# Altium footprint library PcbLib_ICs.PcbLib: 317 footprints (part 9 of 24)
Each footprint in its own frame and in the unit in brackets; x right, y up, seen from the top. Pads: shape width x height; smd on the part's side, far side on the other; paste and mask are expansions set on the pad; w line width, h text height; cw(c..) or ccw(c..) is an arc to the next point about the centre after c.
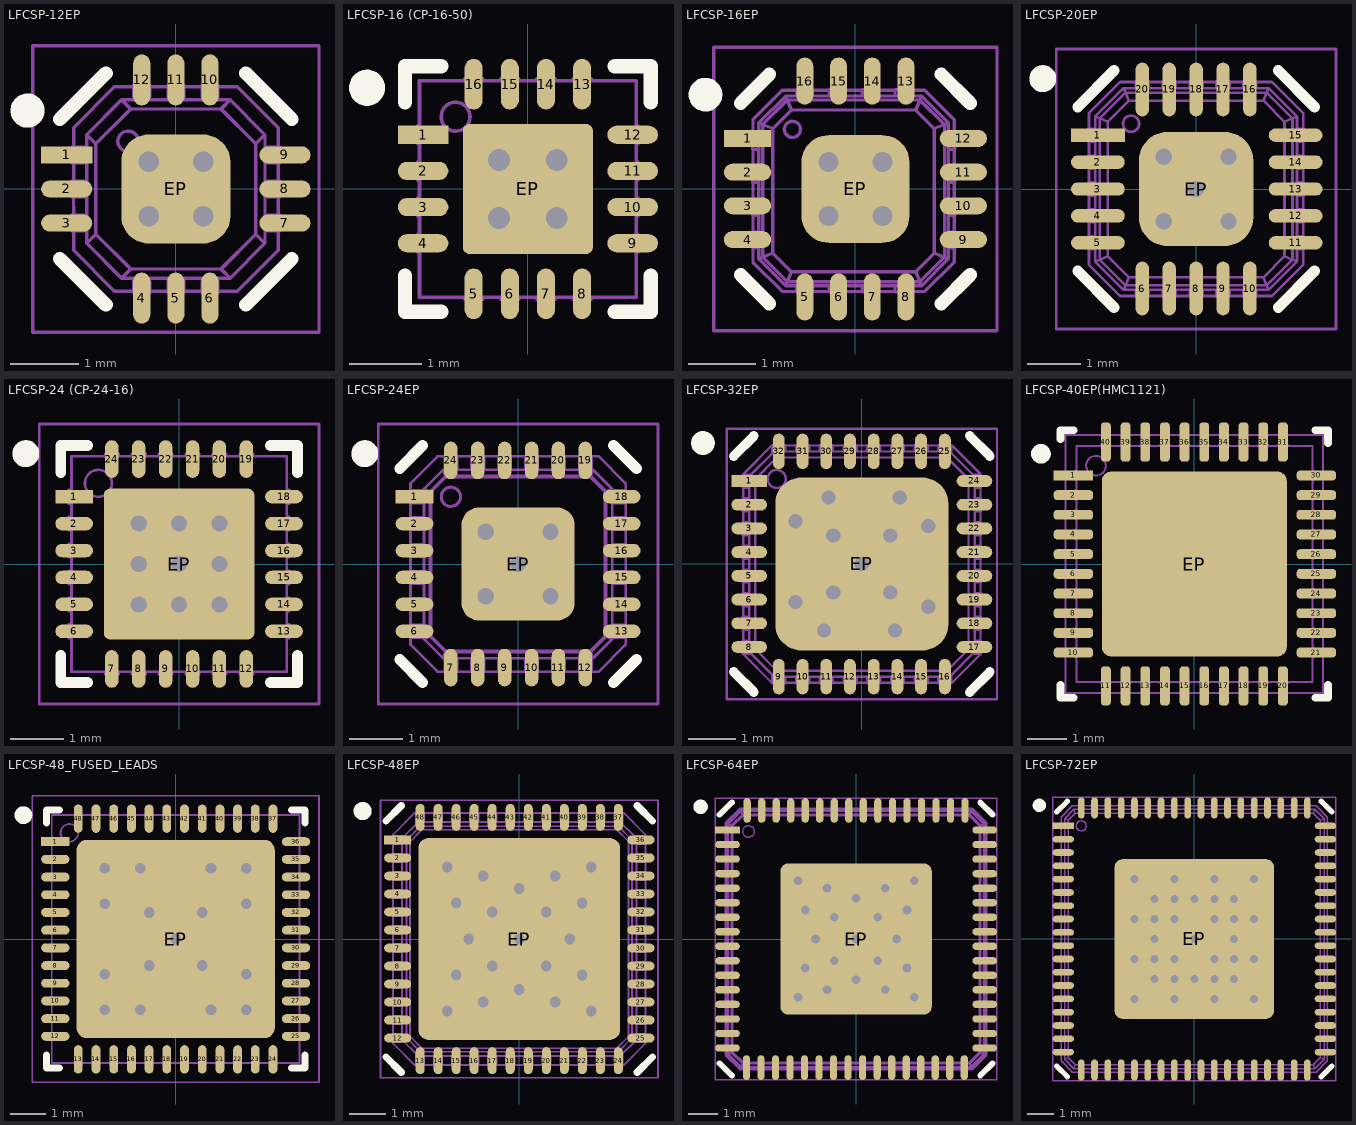
[diagram p8: the footprints below, top view; thin cyan lines are the x and y axes]

## LFCSP-12EP [mm]
height 0.8
pads (13):
  rect 0.75x0.25 smd paste+0 mask+0.08: 1(-1.6,0.5)
  oval 0.75x0.25 smd paste+0 mask+0.08: 2(-1.6,0) 3(-1.6,-0.5) 7(1.6,-0.5) 8(1.6,0) 9(1.6,0.5)
  oval 0.25x0.75 smd paste+0 mask+0.08: 4(-0.5,-1.6) 5(0,-1.6) 6(0.5,-1.6) 10(0.5,1.6) 11(0,1.6) 12(-0.5,1.6)
  rrect50% 1.6x1.6 smd paste-5 mask+0.08: EP(0,0)
via 0.4,0.4 diameter 0.7 hole 0.3
via -0.4,0.4 diameter 0.7 hole 0.3
via 0.4,-0.4 diameter 0.7 hole 0.3
via -0.4,-0.4 diameter 0.7 hole 0.3
Top Overlay:
  circle w0.25: c-2.175,1.15 r0.125
  lines w0.2: -1.7,-1.025 -1.025,-1.7 ; -1.7,1.025 -1.025,1.7 ; 1.025,-1.7 1.7,-1.025 ; 1.025,1.7 1.7,1.025
Top Paste:
  rectangle: -0.8,0.1 -0.1,0.8
  rectangle: 0.1,-0.8 0.8,-0.1
  rectangle: -0.8,-0.8 -0.1,-0.1
  region: 0.8,0.8 0.1,0.8 0.1,0.1 0.8,0.1
Bottom Solder:
  region: -1,1 -0.3,1 0,0.7 0.3,1 1,1 1,0.3 0.7,0 1,-0.3 1,-1 0.3,-1 0,-0.7 -0.3,-1 -1,-1 -1,-0.3 -0.7,0 -1,0.3
Top Assy:
  circle w0.05: c-0.7,0.7 r0.15
  lines w0.05: -1.5,-0.615 -1.5,-0.9 -0.9,-1.5 -0.615,-1.5 ; -1.5,-0.115 -1.5,-0.385 -1.525,-0.385 ; -1.5,0.115 -1.5,0.385 -1.525,0.385 ; -1.5,0.615 -1.5,0.9 -0.9,1.5 -0.615,1.5 ; -0.385,-1.5 -0.115,-1.5 ; -0.385,1.5 -0.115,1.5 ; 0.115,-1.5 0.385,-1.5 ; 0.115,1.5 0.385,1.5 ; 0.615,-1.5 0.9,-1.5 1.5,-0.9 1.5,-0.615 ; 0.615,1.5 0.9,1.5 1.5,0.9 1.5,0.615 ; 1.5,-0.115 1.5,-0.385 1.525,-0.385 ; 1.5,0.115 1.5,0.385 1.525,0.385 ; -1.525,-0.385 -1.525,-0.615 -1.35,-0.615 -1.35,-0.385 -1.525,-0.385 ; -1.525,0.385 -1.35,0.385 -1.35,0.615 -1.525,0.615 -1.525,0.385 ; -1.307,-0.797 -0.797,-1.307 ; -1.307,-0.797 -1.174,-0.663 ; -1.307,-0.797 -1.307,0.797 ; -1.307,0.797 -1.174,0.663 ; -1.307,0.797 -0.797,1.307 ; -1.174,-0.663 -0.663,-1.174 ; -1.174,-0.663 -1.174,0.663 ; -1.174,0.663 -0.663,1.174 ; -0.797,-1.307 -0.663,-1.174 ; -0.797,-1.307 0.797,-1.307 ; -0.797,1.307 -0.663,1.174 ; -0.797,1.307 0.797,1.307 ; -0.663,-1.174 0.663,-1.174 ; -0.663,1.174 0.663,1.174 ; 0.663,-1.174 0.797,-1.307 ; 0.663,-1.174 1.174,-0.663 ; 0.663,1.174 1.174,0.663 ; 0.663,1.174 0.797,1.307 ; 0.797,-1.307 1.307,-0.797 ; 0.797,1.307 1.307,0.797 ; 1.174,-0.663 1.307,-0.797 ; 1.174,-0.663 1.174,0.663 ; 1.174,0.663 1.307,0.797 ; 1.307,-0.797 1.307,0.797 ; 1.525,-0.385 1.35,-0.385 1.35,-0.615 1.525,-0.615 1.525,-0.385 ; 1.525,0.385 1.525,0.615 1.35,0.615 1.35,0.385 1.525,0.385 ; -1.525,-0.115 -1.525,0.115 -1.35,0.115 -1.35,-0.115 -1.525,-0.115 ; -0.615,-1.525 -0.615,-1.35 -0.385,-1.35 -0.385,-1.525 -0.615,-1.525 ; -0.615,1.35 -0.385,1.35 -0.385,1.525 -0.615,1.525 -0.615,1.35 ; -0.115,-1.525 0.115,-1.525 0.115,-1.35 -0.115,-1.35 -0.115,-1.525 ; -0.115,1.35 0.115,1.35 0.115,1.525 -0.115,1.525 -0.115,1.35 ; 0.385,-1.525 0.385,-1.35 0.615,-1.35 0.615,-1.525 0.385,-1.525 ; 0.385,1.35 0.615,1.35 0.615,1.525 0.385,1.525 0.385,1.35 ; 1.35,-0.115 1.35,0.115 1.525,0.115 1.525,-0.115 1.35,-0.115
  text ".Designator" at -2.579,-0.349 h1.5
Top Text:
  lines w0.05: -2.1,-2.1 2.1,-2.1 2.1,2.1 -2.1,2.1 -2.1,-2.1
  lines w0.1: -0.5,0 0.5,0 ; 0,-0.5 0,0.5
3D body "User Library-LFCSP.STEP": height 0.85, standoff 0, extent -1.525,-1.525 1.525,1.525

## LFCSP-16 (CP-16-50) [mm] "3x3mm LFCSP-16 Package"
height 0.8
pads (17):
  rect 0.7x0.25 smd paste+0 mask+0.05: 1(-1.45,0.75)
  oval 0.7x0.25 smd paste+0 mask+0.05: 2(-1.45,0.25) 3(-1.45,-0.25) 4(-1.45,-0.75) 9(1.45,-0.75) 10(1.45,-0.25) 11(1.45,0.25) 12(1.45,0.75)
  oval 0.25x0.7 smd paste+0 mask+0.05: 5(-0.75,-1.45) 6(-0.25,-1.45) 7(0.25,-1.45) 8(0.75,-1.45) 13(0.75,1.45) 14(0.25,1.45) 15(-0.25,1.45) 16(-0.75,1.45)
  rrect10% 1.8x1.8 smd paste-5 mask+0.05: EP(0,0)
via 0.4,0.4 diameter 0.7 hole 0.3
via -0.4,0.4 diameter 0.7 hole 0.3
via 0.4,-0.4 diameter 0.7 hole 0.3
via -0.4,-0.4 diameter 0.7 hole 0.3
Top Overlay:
  circle w0.25: c-2.225,1.4 r0.125
  lines w0.2: -1.7,-1.2 -1.7,-1.7 -1.2,-1.7 ; -1.7,1.2 -1.7,1.7 -1.2,1.7 ; 1.2,-1.7 1.7,-1.7 1.7,-1.2 ; 1.2,1.7 1.7,1.7 1.7,1.2
Top Paste:
  rectangle: -0.8,0.1 -0.1,0.8
  rectangle: 0.1,-0.8 0.8,-0.1
  rectangle: -0.8,-0.8 -0.1,-0.1
  region: 0.8,0.8 0.1,0.8 0.1,0.1 0.8,0.1
Bottom Solder:
  region: -1,1 -0.3,1 0,0.7 0.3,1 1,1 1,0.3 0.7,0 1,-0.3 1,-1 0.3,-1 0,-0.7 -0.3,-1 -1,-1 -1,-0.3 -0.7,0 -1,0.3
Top Assy:
  circle w0.05: c-1,1 r0.2
  lines w0.05: -1.5,-0.875 -1.521,-0.875 -1.521,-0.625 -1.5,-0.625 ; -1.5,-0.375 -1.521,-0.375 -1.521,-0.125 -1.5,-0.125 ; -1.5,0.125 -1.521,0.125 -1.521,0.375 -1.5,0.375 ; -1.5,0.625 -1.521,0.625 -1.521,0.875 -1.5,0.875 ; -0.875,-1.5 -0.875,-1.521 -0.625,-1.521 -0.625,-1.5 ; -0.875,1.5 -0.875,1.521 -0.625,1.521 -0.625,1.5 ; -0.375,-1.5 -0.375,-1.521 -0.125,-1.521 -0.125,-1.5 ; -0.375,1.5 -0.375,1.521 -0.125,1.521 -0.125,1.5 ; 0.125,-1.5 0.125,-1.521 0.375,-1.521 0.375,-1.5 ; 0.125,1.5 0.125,1.521 0.375,1.521 0.375,1.5 ; 0.625,-1.5 0.625,-1.521 0.875,-1.521 0.875,-1.5 ; 0.625,1.5 0.625,1.521 0.875,1.521 0.875,1.5 ; 1.5,-0.875 1.521,-0.875 1.521,-0.625 1.5,-0.625 ; 1.5,-0.375 1.521,-0.375 1.521,-0.125 1.5,-0.125 ; 1.5,0.125 1.521,0.125 1.521,0.375 1.5,0.375 ; 1.5,0.625 1.521,0.625 1.521,0.875 1.5,0.875 ; -1.5,-1.5 -1.5,1.5 1.5,1.5 1.5,-1.5 -1.5,-1.5
  text ".Designator" at -2.579,-0.349 h1.5
Top Text:
  lines w0.1: -0.5,0 0.5,0 ; 0,-0.5 0,0.5
3D body "LFCSP-16.STEP": height 0.87, standoff 0, extent -1.52,-1.52 1.52,1.52

## LFCSP-16EP [mm] "3x3mm LFCSP-16 Package"
height 0.8
pads (17):
  rect 0.7x0.25 smd paste+0 mask+0.08: 1(-1.6,0.75)
  oval 0.7x0.25 smd paste+0 mask+0.08: 2(-1.6,0.25) 3(-1.6,-0.25) 4(-1.6,-0.75) 9(1.6,-0.75) 10(1.6,-0.25) 11(1.6,0.25) 12(1.6,0.75)
  oval 0.25x0.7 smd paste+0 mask+0.08: 5(-0.75,-1.6) 6(-0.25,-1.6) 7(0.25,-1.6) 8(0.75,-1.6) 13(0.75,1.6) 14(0.25,1.6) 15(-0.25,1.6) 16(-0.75,1.6)
  rrect50% 1.6x1.6 smd paste-5 mask+0.08: EP(0,0)
via -0.4,-0.4 diameter 0.7 hole 0.3
via 0.4,-0.4 diameter 0.7 hole 0.3
via -0.4,0.4 diameter 0.7 hole 0.3
via 0.4,0.4 diameter 0.7 hole 0.3
Top Overlay:
  circle w0.25: c-2.225,1.4 r0.125
  lines w0.2: -1.7,-1.275 -1.275,-1.7 ; -1.7,1.275 -1.275,1.7 ; 1.275,-1.7 1.7,-1.275 ; 1.275,1.7 1.7,1.275
Top Paste:
  region: 0.8,0.8 0.1,0.8 0.1,0.1 0.8,0.1
  rectangle: -0.8,-0.8 -0.1,-0.1
  rectangle: 0.1,-0.8 0.8,-0.1
  rectangle: -0.8,0.1 -0.1,0.8
Bottom Solder:
  region: -1,1 -0.3,1 0,0.7 0.3,1 1,1 1,0.3 0.7,0 1,-0.3 1,-1 0.3,-1 0,-0.7 -0.3,-1 -1,-1 -1,-0.3 -0.7,0 -1,0.3
Top Assy:
  circle w0.05: c-0.935,0.884 r0.12
  lines w0.05: -1.52,-0.875 -1.52,-1.085 -1.085,-1.52 -0.875,-1.52 ; -1.52,-0.642 -1.52,-0.387 ; -1.52,-0.155 -1.52,0.1 ; -1.52,0.333 -1.52,0.588 ; -1.52,0.82 -1.52,1.03 -1.085,1.465 -0.875,1.465 ; -1.434,-0.875 -1.527,-0.875 -1.527,-0.642 -1.434,-0.642 ; -1.434,-0.387 -1.527,-0.387 -1.527,-0.155 -1.434,-0.155 ; -1.434,0.1 -1.527,0.1 -1.527,0.333 -1.434,0.333 ; -1.434,0.588 -1.527,0.588 -1.527,0.82 -1.434,0.82 ; -0.875,-1.434 -0.875,-1.527 -0.642,-1.527 -0.642,-1.434 ; -0.875,1.379 -0.875,1.473 -0.642,1.473 -0.642,1.379 ; -0.642,-1.52 -0.387,-1.52 ; -0.642,1.465 -0.387,1.465 ; -0.387,-1.434 -0.387,-1.527 -0.155,-1.527 -0.155,-1.434 ; -0.387,1.379 -0.387,1.473 -0.155,1.473 -0.155,1.379 ; -0.155,-1.52 0.1,-1.52 ; -0.155,1.465 0.1,1.465 ; 0.1,-1.434 0.1,-1.527 0.333,-1.527 0.333,-1.434 ; 0.1,1.379 0.1,1.473 0.333,1.473 0.333,1.379 ; 0.333,-1.52 0.588,-1.52 ; 0.333,1.465 0.588,1.465 ; 0.588,-1.434 0.588,-1.527 0.82,-1.527 0.82,-1.434 ; 0.588,1.379 0.588,1.473 0.82,1.473 0.82,1.379 ; 0.82,-1.52 1.03,-1.52 1.465,-1.085 1.465,-0.875 ; 0.82,1.465 1.03,1.465 1.465,1.03 1.465,0.82 ; 1.379,-0.875 1.473,-0.875 1.473,-0.642 1.379,-0.642 ; 1.379,-0.387 1.473,-0.387 1.473,-0.155 1.379,-0.155 ; 1.379,0.1 1.473,0.1 1.473,0.333 1.379,0.333 ; 1.379,0.588 1.473,0.588 1.473,0.82 1.379,0.82 ; 1.465,-0.642 1.465,-0.387 ; 1.465,-0.155 1.465,0.1 ; 1.465,0.333 1.465,0.588 ; -1.434,-1.036 -1.434,0.981 ; -1.434,-1.036 -1.375,-1.012 ; -1.434,-1.036 -1.036,-1.434 ; -1.434,0.981 -1.036,1.379 ; -1.434,0.981 -1.375,0.957 ; -1.375,-1.012 -1.375,0.957 ; -1.375,-1.012 -1.012,-1.375 ; -1.375,-1.012 -1.226,-0.95 ; -1.375,0.957 -1.012,1.32 ; -1.375,0.957 -1.226,0.895 ; -1.226,-0.95 -1.226,0.895 ; -1.226,-0.95 -0.95,-1.226 ; -1.226,0.895 -0.95,1.171 ; -1.036,-1.434 0.981,-1.434 ; -1.036,-1.434 -1.012,-1.375 ; -1.036,1.379 0.981,1.379 ; -1.036,1.379 -1.012,1.32 ; -1.012,-1.375 0.957,-1.375 ; -1.012,-1.375 -0.95,-1.226 ; -1.012,1.32 0.957,1.32 ; -1.012,1.32 -0.95,1.171 ; -0.95,-1.226 0.896,-1.226 ; -0.95,1.171 0.896,1.171 ; 0.896,-1.226 1.172,-0.95 ; 0.896,-1.226 0.957,-1.375 ; 0.896,1.171 1.172,0.895 ; 0.896,1.171 0.957,1.32 ; 0.957,-1.375 1.32,-1.012 ; 0.957,-1.375 0.981,-1.434 ; 0.957,1.32 1.32,0.957 ; 0.957,1.32 0.981,1.379 ; 0.981,-1.434 1.379,-1.036 ; 0.981,1.379 1.379,0.981 ; 1.172,-0.95 1.172,0.895 ; 1.172,-0.95 1.32,-1.012 ; 1.172,0.895 1.32,0.957 ; 1.32,-1.012 1.32,0.957 ; 1.32,-1.012 1.379,-1.036 ; 1.32,0.957 1.379,0.981 ; 1.379,-1.036 1.379,0.981
  text ".Designator" at -2.579,-0.349 h1.5
Top Text:
  lines w0.05: -2.1,-2.1 2.1,-2.1 2.1,2.1 -2.1,2.1 -2.1,-2.1
  lines w0.1: -0.5,0 0.5,0 ; 0,-0.5 0,0.5
3D body "User Library-ADCLK925.step": height 0.9, standoff 0, extent -1.52,-1.52 1.52,1.52

## LFCSP-20EP [mm] "LFCSP-20 4x4mm"
height 0.8
pads (21):
  rect 1x0.25 smd paste+0 mask+0.08: 1(-1.825,1)
  oval 1x0.25 smd paste+0 mask+0.08: 2(-1.825,0.5) 3(-1.825,0) 4(-1.825,-0.5) 5(-1.825,-1) 11(1.85,-1) 12(1.85,-0.5) 13(1.85,0) 14(1.85,0.5) 15(1.85,1)
  oval 0.25x1 smd paste+0 mask+0.08: 6(-1,-1.85) 7(-0.5,-1.85) 8(0,-1.85) 9(0.5,-1.85) 10(1,-1.85) 16(1,1.85) 17(0.5,1.85) 18(0,1.85) 19(-0.5,1.85) 20(-1,1.85)
  rrect50% 2.125x2.125 smd paste-10 mask+0.08: EP(0,0)
via 0.6,-0.6 diameter 0.7 hole 0.3
via -0.6,-0.6 diameter 0.7 hole 0.3
via 0.6,0.6 diameter 0.7 hole 0.3
via -0.6,0.6 diameter 0.7 hole 0.3
via 0,0 diameter 0.7 hole 0.3
Top Overlay:
  circle w0.25: c-2.85,2.05 r0.125
  lines w0.2: -2.2,-1.525 -1.525,-2.2 ; -2.2,1.525 -1.525,2.2 ; 1.525,-2.2 2.2,-1.525 ; 1.525,2.2 2.2,1.525
Top Paste:
  region: 0.3,1.1 -0.3,1.1 -0.3,0.5 0.3,0.5
  rectangle: -1.1,-0.3 -0.5,0.3
  rectangle: -0.3,-0.3 0.3,0.3
  rectangle: -1.1,0.5 -0.5,1.1
  rectangle: 0.5,-0.3 1.1,0.3
  rectangle: 0.5,0.5 1.1,1.1
  rectangle: -1.1,-1.1 -0.5,-0.5
  rectangle: -0.3,-1.1 0.3,-0.5
  rectangle: 0.5,-1.1 1.1,-0.5
Bottom Solder:
  region: -1.2,1.2 -0.3,1.2 0,0.9 0.3,1.2 1.2,1.2 1.2,0.3 0.9,0 1.2,-0.3 1.2,-1.2 0.3,-1.2 0,-0.9 -0.3,-1.2 -1.2,-1.2 -1.2,-0.3 -0.9,0 -1.2,0.3
Top Assy:
  circle w0.05: c-1.21,1.213 r0.15
  lines w0.05: -1.99,-1.12 -1.99,-1.41 -1.41,-1.99 -1.12,-1.99 ; -1.99,-0.88 -1.99,-0.62 ; -1.99,-0.38 -1.99,-0.12 ; -1.99,0.12 -1.99,0.38 ; -1.99,0.62 -1.99,0.88 ; -1.99,1.12 -1.99,1.41 -1.41,1.99 -1.12,1.99 ; -1.875,-1.12 -2,-1.12 -2,-0.88 -1.875,-0.88 ; -1.875,-0.62 -2,-0.62 -2,-0.38 -1.875,-0.38 ; -1.875,-0.12 -2,-0.12 -2,0.12 -1.875,0.12 ; -1.875,0.38 -2,0.38 -2,0.62 -1.875,0.62 ; -1.875,0.88 -2,0.88 -2,1.12 -1.875,1.12 ; -1.12,-1.875 -1.12,-2 -0.88,-2 -0.88,-1.875 ; -1.12,1.875 -1.12,2 -0.88,2 -0.88,1.875 ; -0.88,-1.99 -0.62,-1.99 ; -0.88,1.99 -0.62,1.99 ; -0.62,-1.875 -0.62,-2 -0.38,-2 -0.38,-1.875 ; -0.62,1.875 -0.62,2 -0.38,2 -0.38,1.875 ; -0.38,-1.99 -0.12,-1.99 ; -0.38,1.99 -0.12,1.99 ; -0.12,-1.875 -0.12,-2 0.12,-2 0.12,-1.875 ; -0.12,1.875 -0.12,2 0.12,2 0.12,1.875 ; 0.12,-1.99 0.38,-1.99 ; 0.12,1.99 0.38,1.99 ; 0.38,-1.875 0.38,-2 0.62,-2 0.62,-1.875 ; 0.38,1.875 0.38,2 0.62,2 0.62,1.875 ; 0.62,-1.99 0.88,-1.99 ; 0.62,1.99 0.88,1.99 ; 0.88,-1.875 0.88,-2 1.12,-2 1.12,-1.875 ; 0.88,1.875 0.88,2 1.12,2 1.12,1.875 ; 1.12,-1.99 1.41,-1.99 1.99,-1.41 1.99,-1.12 ; 1.12,1.99 1.41,1.99 1.99,1.41 1.99,1.12 ; 1.875,-1.12 2,-1.12 2,-0.88 1.875,-0.88 ; 1.875,-0.62 2,-0.62 2,-0.38 1.875,-0.38 ; 1.875,-0.12 2,-0.12 2,0.12 1.875,0.12 ; 1.875,0.38 2,0.38 2,0.62 1.875,0.62 ; 1.875,0.88 2,0.88 2,1.12 1.875,1.12 ; 1.99,-0.88 1.99,-0.62 ; 1.99,-0.38 1.99,-0.12 ; 1.99,0.12 1.99,0.38 ; 1.99,0.62 1.99,0.88 ; -1.875,-1.345 -1.875,1.345 ; -1.875,-1.345 -1.345,-1.875 ; -1.875,-1.345 -1.791,-1.31 ; -1.875,1.345 -1.345,1.875 ; -1.875,1.345 -1.791,1.31 ; -1.791,-1.31 -1.791,1.31 ; -1.791,-1.31 -1.31,-1.791 ; -1.791,-1.31 -1.643,-1.249 ; -1.791,1.31 -1.31,1.791 ; -1.791,1.31 -1.643,1.249 ; -1.643,-1.249 -1.643,1.249 ; -1.643,-1.249 -1.249,-1.643 ; -1.643,1.249 -1.249,1.643 ; -1.345,-1.875 1.345,-1.875 ; -1.345,-1.875 -1.31,-1.791 ; -1.345,1.875 1.345,1.875 ; -1.345,1.875 -1.31,1.791 ; -1.31,-1.791 1.31,-1.791 ; -1.31,-1.791 -1.249,-1.643 ; -1.31,1.791 1.31,1.791 ; -1.31,1.791 -1.249,1.643 ; -1.249,-1.643 1.249,-1.643 ; -1.249,1.643 1.249,1.643 ; 1.249,-1.643 1.643,-1.249 ; 1.249,-1.643 1.31,-1.791 ; 1.249,1.643 1.643,1.249 ; 1.249,1.643 1.31,1.791 ; 1.31,-1.791 1.791,-1.31 ; 1.31,-1.791 1.345,-1.875 ; 1.31,1.791 1.791,1.31 ; 1.31,1.791 1.345,1.875 ; 1.345,-1.875 1.875,-1.345 ; 1.345,1.875 1.875,1.345 ; 1.643,-1.249 1.643,1.249 ; 1.643,-1.249 1.791,-1.31 ; 1.643,1.249 1.791,1.31 ; 1.791,-1.31 1.791,1.31 ; 1.791,-1.31 1.875,-1.345 ; 1.791,1.31 1.875,1.345 ; 1.875,-1.345 1.875,1.345
  text ".Designator" at -3.443,-0.467 h2
Top Text:
  lines w0.05: -2.6,-2.6 -2.6,2.6 2.6,2.6 2.6,-2.6 -2.6,-2.6
  lines w0.1: -0.5,0 0.5,0 ; 0,-0.5 0,0.5
3D body "User Library-LFCSP-20.STEP": height 1, standoff 0, extent -2,-2 2,2

## LFCSP-24 (CP-24-16) [mm] "Case style CP-24-16"
height 0.8
pads (25):
  rect 0.7x0.25 smd paste+0 mask+0.05: 1(-1.95,1.25)
  oval 0.7x0.25 smd paste+0 mask+0.05: 2(-1.95,0.75) 3(-1.95,0.25) 4(-1.95,-0.25) 5(-1.95,-0.75) 6(-1.95,-1.25) 13(1.95,-1.25) 14(1.95,-0.75) 15(1.95,-0.25) 16(1.95,0.25) 17(1.95,0.75) 18(1.95,1.25)
  oval 0.25x0.7 smd paste+0 mask+0.05: 7(-1.25,-1.95) 8(-0.75,-1.95) 9(-0.25,-1.95) 10(0.25,-1.95) 11(0.75,-1.95) 12(1.25,-1.95) 19(1.25,1.95) 20(0.75,1.95) 21(0.25,1.95) 22(-0.25,1.95) 23(-0.75,1.95) 24(-1.25,1.95)
  rrect8% 2.8x2.8 smd paste-5 mask+0.05: EP(0,0)
via 0,-0.75 diameter 0.7 hole 0.3
via -0.75,0 diameter 0.7 hole 0.3
via 0.75,0 diameter 0.7 hole 0.3
via 0,0.75 diameter 0.7 hole 0.3
via 0,0 diameter 0.7 hole 0.3
via -0.75,-0.75 diameter 0.7 hole 0.3
via 0.75,-0.75 diameter 0.7 hole 0.3
via 0.75,0.75 diameter 0.7 hole 0.3
via -0.75,0.75 diameter 0.7 hole 0.3
Top Overlay:
  circle w0.25: c-2.85,2.05 r0.125
  lines w0.2: -2.2,-1.7 -2.2,-2.2 -1.7,-2.2 ; -2.2,1.7 -2.2,2.2 -1.7,2.2 ; 1.7,-2.2 2.2,-2.2 2.2,-1.7 ; 1.7,2.2 2.2,2.2 2.2,1.7
Top Paste:
  region: 0.3,1.1 -0.3,1.1 -0.3,0.5 0.3,0.5
  rectangle: -1.1,-0.3 -0.5,0.3
  rectangle: -0.3,-0.3 0.3,0.3
  rectangle: -1.1,0.5 -0.5,1.1
  rectangle: 0.5,-0.3 1.1,0.3
  rectangle: 0.5,0.5 1.1,1.1
  rectangle: -1.1,-1.1 -0.5,-0.5
  rectangle: -0.3,-1.1 0.3,-0.5
  rectangle: 0.5,-1.1 1.1,-0.5
Bottom Solder:
  region: -1.5,1.5 -0.3,1.5 0,1.2 0.3,1.5 1.5,1.5 1.5,0.3 1.2,0 1.5,-0.3 1.5,-1.5 0.3,-1.5 0,-1.2 -0.3,-1.5 -1.5,-1.5 -1.5,-0.3 -1.2,0 -1.5,0.3
Top Assy:
  circle w0.05: c-1.5,1.5 r0.25
  lines w0.05: -2,-1.375 -2.05,-1.375 -2.05,-1.125 -2,-1.125 ; -2,-0.875 -2.05,-0.875 -2.05,-0.625 -2,-0.625 ; -2,-0.375 -2.05,-0.375 -2.05,-0.125 -2,-0.125 ; -2,0.125 -2.05,0.125 -2.05,0.375 -2,0.375 ; -2,0.625 -2.05,0.625 -2.05,0.875 -2,0.875 ; -2,1.125 -2.05,1.125 -2.05,1.375 -2,1.375 ; -1.375,-2 -1.375,-2.05 -1.125,-2.05 -1.125,-2 ; -1.375,2 -1.375,2.05 -1.125,2.05 -1.125,2 ; -0.875,-2 -0.875,-2.05 -0.625,-2.05 -0.625,-2 ; -0.875,2 -0.875,2.05 -0.625,2.05 -0.625,2 ; -0.375,-2 -0.375,-2.05 -0.125,-2.05 -0.125,-2 ; -0.375,2 -0.375,2.05 -0.125,2.05 -0.125,2 ; 0.125,-2 0.125,-2.05 0.375,-2.05 0.375,-2 ; 0.125,2 0.125,2.05 0.375,2.05 0.375,2 ; 0.625,-2 0.625,-2.05 0.875,-2.05 0.875,-2 ; 0.625,2 0.625,2.05 0.875,2.05 0.875,2 ; 1.125,-2 1.125,-2.05 1.375,-2.05 1.375,-2 ; 1.125,2 1.125,2.05 1.375,2.05 1.375,2 ; 2,-1.375 2.05,-1.375 2.05,-1.125 2,-1.125 ; 2,-0.875 2.05,-0.875 2.05,-0.625 2,-0.625 ; 2,-0.375 2.05,-0.375 2.05,-0.125 2,-0.125 ; 2,0.125 2.05,0.125 2.05,0.375 2,0.375 ; 2,0.625 2.05,0.625 2.05,0.875 2,0.875 ; 2,1.125 2.05,1.125 2.05,1.375 2,1.375 ; -2,-2 2,-2 2,2 -2,2 -2,-2
  text ".Designator" at -3.443,-0.467 h2
Top Text:
  lines w0.05: -2.6,-2.6 2.6,-2.6 2.6,2.6 -2.6,2.6 -2.6,-2.6
  lines w0.1: -0.5,0 0.5,0 ; 0,-0.5 0,0.5
3D body "LFCSP-24 (CP-24-16).STEP": height 0.9, standoff 0, extent -2.05,-2.05 2.05,2.05

## LFCSP-24EP [mm]
height 0.8
pads (25):
  rect 0.7x0.25 smd paste+0 mask+0.08: 1(-1.925,1.25)
  oval 0.7x0.25 smd paste+0 mask+0.08: 2(-1.925,0.75) 3(-1.925,0.25) 4(-1.925,-0.25) 5(-1.925,-0.75) 6(-1.925,-1.25) 13(1.925,-1.25) 14(1.925,-0.75) 15(1.925,-0.25) 16(1.925,0.25) 17(1.925,0.75) 18(1.925,1.25)
  oval 0.25x0.7 smd paste+0 mask+0.08: 7(-1.25,-1.925) 8(-0.75,-1.925) 9(-0.25,-1.925) 10(0.25,-1.925) 11(0.75,-1.925) 12(1.25,-1.925) 19(1.25,1.925) 20(0.75,1.925) 21(0.25,1.925) 22(-0.25,1.925) 23(-0.75,1.925) 24(-1.25,1.925)
  rrect30% 2.1x2.1 smd paste-5 mask+0.08: EP(0,0)
via 0,0 diameter 0.7 hole 0.3
via -0.6,0.6 diameter 0.7 hole 0.3
via 0.6,0.6 diameter 0.7 hole 0.3
via -0.6,-0.6 diameter 0.7 hole 0.3
via 0.6,-0.6 diameter 0.7 hole 0.3
Top Overlay:
  circle w0.25: c-2.85,2.05 r0.125
  lines w0.2: -2.2,1.775 -1.775,2.2 ; -1.775,-2.2 -2.2,-1.775 ; 1.775,-2.2 2.2,-1.775 ; 2.2,1.775 1.775,2.2 ; -2.2,-1.775 -2.2,-1.775 ; 1.775,2.2 1.775,2.2
Top Paste:
  region: 0.3,1.1 -0.3,1.1 -0.3,0.5 0.3,0.5
  rectangle: -1.1,-0.3 -0.5,0.3
  rectangle: -0.3,-0.3 0.3,0.3
  rectangle: -1.1,0.5 -0.5,1.1
  rectangle: 0.5,-0.3 1.1,0.3
  rectangle: 0.5,0.5 1.1,1.1
  rectangle: -1.1,-1.1 -0.5,-0.5
  rectangle: -0.3,-1.1 0.3,-0.5
  rectangle: 0.5,-1.1 1.1,-0.5
Bottom Solder:
  region: -1.2,1.2 -0.3,1.2 0,0.9 0.3,1.2 1.2,1.2 1.2,0.3 0.9,0 1.2,-0.3 1.2,-1.2 0.3,-1.2 0,-0.9 -0.3,-1.2 -1.2,-1.2 -1.2,-0.3 -0.9,0 -1.2,0.3
Top Assy:
  drawing of 194 lines, arcs and shapes, not listed
  text ".Designator" at -3.443,-0.467 h2
Top Text:
  lines w0.05: -2.6,-2.6 2.6,-2.6 2.6,2.6 -2.6,2.6 -2.6,-2.6
  lines w0.1: -0.5,0 0.5,0 ; 0,-0.5 0,0.5
3D body "User Library-LFCSP-24.step": height 0.83, standoff -0.02, extent -2,-2 2,2

## LFCSP-32EP [mm]
pads (33):
  rect 0.75x0.25 smd paste+0 mask+0.08: 1(-2.375,1.75)
  oval 0.75x0.25 smd paste+0 mask+0.08: 2(-2.375,1.25) 3(-2.375,0.75) 4(-2.375,0.25) 5(-2.375,-0.25) 6(-2.375,-0.75) 7(-2.375,-1.25) 8(-2.375,-1.75) 17(2.375,-1.75) 18(2.375,-1.25) 19(2.375,-0.75) 20(2.375,-0.25) 21(2.375,0.25) 22(2.375,0.75) 23(2.375,1.25) 24(2.375,1.75)
  oval 0.25x0.75 smd paste+0 mask+0.08: 9(-1.75,-2.375) 10(-1.25,-2.375) 11(-0.75,-2.375) 12(-0.25,-2.375) 13(0.25,-2.375) 14(0.75,-2.375) 15(1.25,-2.375) 16(1.75,-2.375) 25(1.75,2.375) 26(1.25,2.375) 27(0.75,2.375) 28(0.25,2.375) 29(-0.25,2.375) 30(-0.75,2.375) 31(-1.25,2.375) 32(-1.75,2.375)
  rrect30% 3.65x3.65 smd paste-10 mask+0.08: EP(0,0)
via 0,0 diameter 0.7 hole 0.3
via -0.6,0.6 diameter 0.7 hole 0.3
via 0.6,0.6 diameter 0.7 hole 0.3
via 0.8,1.4 diameter 0.7 hole 0.3
via 1.4,0.8 diameter 0.7 hole 0.3
via -0.7,1.4 diameter 0.7 hole 0.3
via -1.4,0.9 diameter 0.7 hole 0.3
via 1.4,-0.9 diameter 0.7 hole 0.3
via 0.7,-1.4 diameter 0.7 hole 0.3
via -1.4,-0.8 diameter 0.7 hole 0.3
via -0.8,-1.4 diameter 0.7 hole 0.3
via -0.6,-0.6 diameter 0.7 hole 0.3
via 0.6,-0.6 diameter 0.7 hole 0.3
Top Overlay:
  circle w0.25: c-3.35,2.55 r0.125
  lines w0.2: -2.7,2.275 -2.275,2.7 ; -2.275,-2.7 -2.7,-2.275 ; 2.275,-2.7 2.7,-2.275 ; 2.7,2.275 2.275,2.7 ; -2.7,-2.275 -2.7,-2.275 ; 2.275,2.7 2.275,2.7
Top Paste:
  rectangle: 0.9,-1.5 1.5,-0.9
  rectangle: -1.5,-1.5 -0.9,-0.9
  rectangle: -0.7,-1.5 -0.1,-0.9
  rectangle: 0.1,-1.5 0.7,-0.9
  rectangle: 0.9,0.1 1.5,0.7
  rectangle: 0.9,0.9 1.5,1.5
  rectangle: 0.9,-0.7 1.5,-0.1
  region: -0.1,1.5 -0.7,1.5 -0.7,0.9 -0.1,0.9
  rectangle: -1.5,0.1 -0.9,0.7
  rectangle: -0.7,0.1 -0.1,0.7
  rectangle: -1.5,0.9 -0.9,1.5
  rectangle: 0.1,0.1 0.7,0.7
  rectangle: 0.1,0.9 0.7,1.5
  rectangle: -1.5,-0.7 -0.9,-0.1
  rectangle: -0.7,-0.7 -0.1,-0.1
  rectangle: 0.1,-0.7 0.7,-0.1
Bottom Solder:
  region: -1.9,1.9 -0.6,1.9 0,1.4 0.6,1.9 1.9,1.9 1.9,0.6 1.4,0 1.9,-0.6 1.9,-1.9 0.6,-1.9 0,-1.4 -0.6,-1.9 -1.9,-1.9 -1.9,-0.6 -1.4,0 -1.9,0.6
Top Assy:
  drawing of 225 lines, arcs and shapes, not listed
  text ".Designator" at -3.443,-0.467 h2
Top Text:
  lines w0.05: -2.85,-2.85 -2.85,2.85 2.85,2.85 2.85,-2.85 -2.85,-2.85
  lines w0.1: -0.5,0 0.5,0 ; 0,-0.5 0,0.5
3D body "User Library-LFCSP-32.step": height 0.89, standoff -0.04, extent -2.5,-2.495 2.52,2.525
